# Altium footprint library LongMen.PcbLib: 245 footprints (part 16 of 16)
Each footprint in its own frame and in the unit in brackets; x right, y up, seen from the top. Pads: shape width x height; smd on the part's side, far side on the other; paste and mask are expansions set on the pad; w line width, h text height; cw(c..) or ccw(c..) is an arc to the next point about the centre after c.
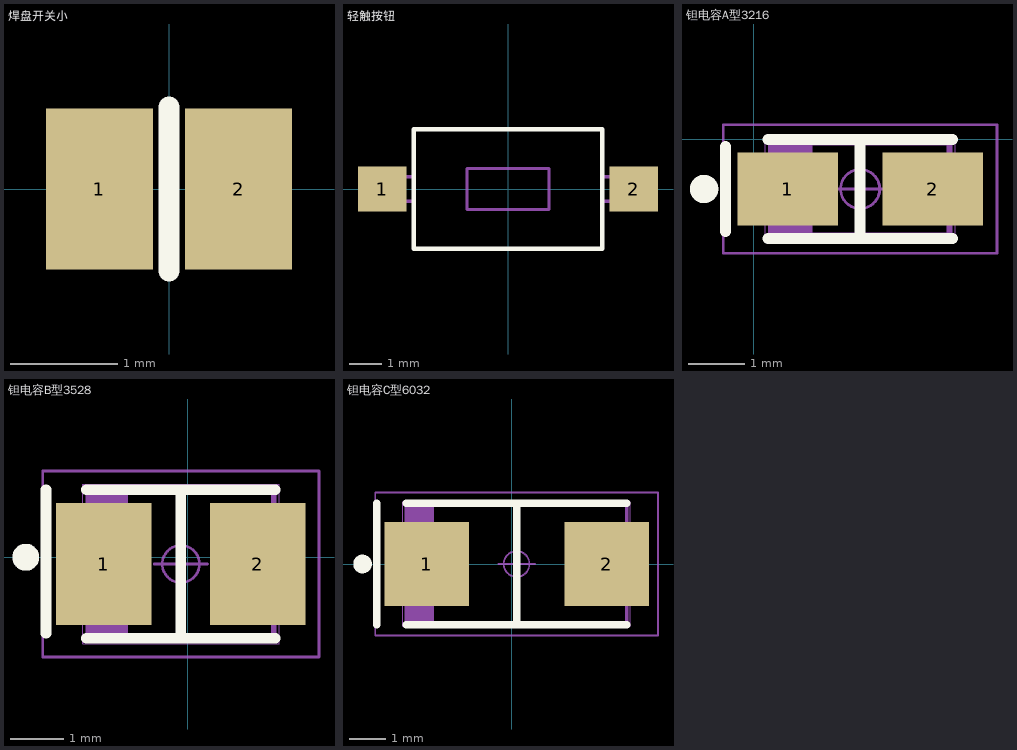
[diagram p15: the footprints below, top view; thin cyan lines are the x and y axes]

## 焊盘开关小 [mm]
pads (2):
  rect 1x1.5 smd: 1(-0.65,0) 2(0.65,0)
Top Overlay:
  lines w0.2: 0,-0.762 0,0.762

## 轻触按钮 [mm]
height 2.55
pads (2):
  rect 1.5x1.4 smd: 1(-3.9,0) 2(3.9,0)
Top Overlay:
  lines w0.15: -2.921,-1.85 2.921,-1.85 2.921,1.85 -2.921,1.85 -2.921,-1.85
Mechanical 16:
  lines w0.1: -4.318,-0.381 -4.318,0.381 -2.921,0.381 -2.921,-0.381 -4.318,-0.381 ; -1.27,-0.635 -1.27,0.635 1.27,0.635 1.27,-0.635 -1.27,-0.635 ; 2.921,-0.381 4.318,-0.381 4.318,0.381 2.921,0.381 2.921,-0.381
3D body: height 2.55, standoff 0, extent -2.996,-1.925 2.996,1.925
3D body: height 2.8, standoff 0, extent -1.32,-0.685 1.32,0.685
3D body: height 0.5, standoff 0, extent -4.317,-0.38 -2.922,0.38
3D body: height 0.5, standoff 0, extent 2.922,-0.38 4.317,0.38

## 钽电容A型3216 [mm]
pads (2):
  rect 1.8x1.3 smd: 1(0.605,-0.889) 2(3.205,-0.889)
Top Overlay:
  circle w0.254: c-0.889,-0.889 r0.127
  lines w0.2: -0.508,-1.651 -0.508,-0.127 ; 0.254,-1.778 3.556,-1.778 ; 0.254,0 3.556,0 ; 1.905,-1.651 1.905,-0.127
Mechanical 1:
  lines w0.1: 0.405,-1.714 0.405,-0.064 ; 0.505,-1.714 0.505,-0.064 ; 0.605,-1.714 0.605,-0.064 ; 0.705,-1.714 0.705,-0.064 ; 0.805,-1.714 0.805,-0.064 ; 0.905,-1.714 0.905,-0.064 ; 1.005,-1.714 1.005,-0.064 ; 0.305,-1.714 0.305,-0.064 3.505,-0.064 3.505,-1.714 0.305,-1.714
Mechanical 16:
  circle w0.05: c1.905,-0.889 r0.35
  lines w0.001: 0.205,-1.789 0.205,0.011 3.605,0.011 3.605,-1.789 0.205,-1.789
  lines w0.05: 1.405,-0.889 2.405,-0.889 ; 1.905,-1.389 1.905,-0.389 ; -0.545,-2.039 -0.545,0.261 4.355,0.261 4.355,-2.039 -0.545,-2.039
3D body: height 1.7, standoff 0, extent 0.205,-1.789 3.605,0.011

## 钽电容B型3528 [mm]
height 4
pads (2):
  rect 1.8x2.3 smd: 1(-1.577,-0.127) 2(1.323,-0.127)
Top Overlay:
  circle w0.254: c-3.048,0 r0.127
  lines w0.2: -2.667,-1.43 -2.667,1.27 ; -1.905,-1.524 1.651,-1.524 ; -1.905,1.27 1.651,1.27 ; -0.127,-1.43 -0.127,1.27
Mechanical 1:
  lines w0.1: -1.777,-1.552 -1.777,1.298 ; -1.677,-1.552 -1.677,1.298 ; -1.577,-1.552 -1.577,1.298 ; -1.477,-1.552 -1.477,1.298 ; -1.377,-1.552 -1.377,1.298 ; -1.277,-1.552 -1.277,1.298 ; -1.177,-1.552 -1.177,1.298 ; -1.877,-1.552 1.623,-1.552 1.623,1.298 -1.877,1.298 -1.877,-1.552
Mechanical 16:
  circle w0.05: c-0.127,-0.127 r0.35
  lines w0.001: -1.977,-1.627 1.723,-1.627 1.723,1.373 -1.977,1.373 -1.977,-1.627
  lines w0.05: -0.627,-0.127 0.373,-0.127 ; -0.127,-0.627 -0.127,0.373 ; -2.727,-1.877 2.473,-1.877 2.473,1.623 -2.727,1.623 -2.727,-1.877
3D body: height 2.03, standoff 0, extent -1.977,-1.592 1.723,1.338

## 钽电容C型6032 [mm]
pads (2):
  rect 2.3x2.3 smd: 1(-2.323,0) 2(2.577,0)
Top Overlay:
  circle w0.254: c-4.064,0 r0.127
  lines w0.2: -3.683,-1.651 -3.683,1.651 ; -2.873,-1.65 3.127,-1.65 ; -2.873,1.65 3.127,1.65 ; 0.127,-1.651 0.127,1.651
Mechanical 1:
  lines w0.1: -2.773,-1.625 -2.773,1.625 ; -2.673,-1.625 -2.673,1.625 ; -2.573,-1.625 -2.573,1.625 ; -2.473,-1.625 -2.473,1.625 ; -2.373,-1.625 -2.373,1.625 ; -2.273,-1.625 -2.273,1.625 ; -2.173,-1.625 -2.173,1.625 ; -2.873,-1.625 3.127,-1.625 3.127,1.625 -2.873,1.625 -2.873,-1.625
Mechanical 16:
  circle w0.05: c0.127,0 r0.35
  lines w0.001: -2.973,-1.7 3.227,-1.7 3.227,1.7 -2.973,1.7 -2.973,-1.7
  lines w0.05: -0.373,0 0.627,0 ; 0.127,-0.5 0.127,0.5 ; -3.723,-1.95 3.977,-1.95 3.977,1.95 -3.723,1.95 -3.723,-1.95
3D body: height 2.5, standoff 0, extent -2.873,-1.6 3.127,1.6